# Altium footprint library Standard2.PcbLib: 423 footprints (part 26 of 27)
Each footprint in its own frame and in the unit in brackets; x right, y up, seen from the top. Pads: shape width x height; smd on the part's side, far side on the other; paste and mask are expansions set on the pad; w line width, h text height; cw(c..) or ccw(c..) is an arc to the next point about the centre after c.
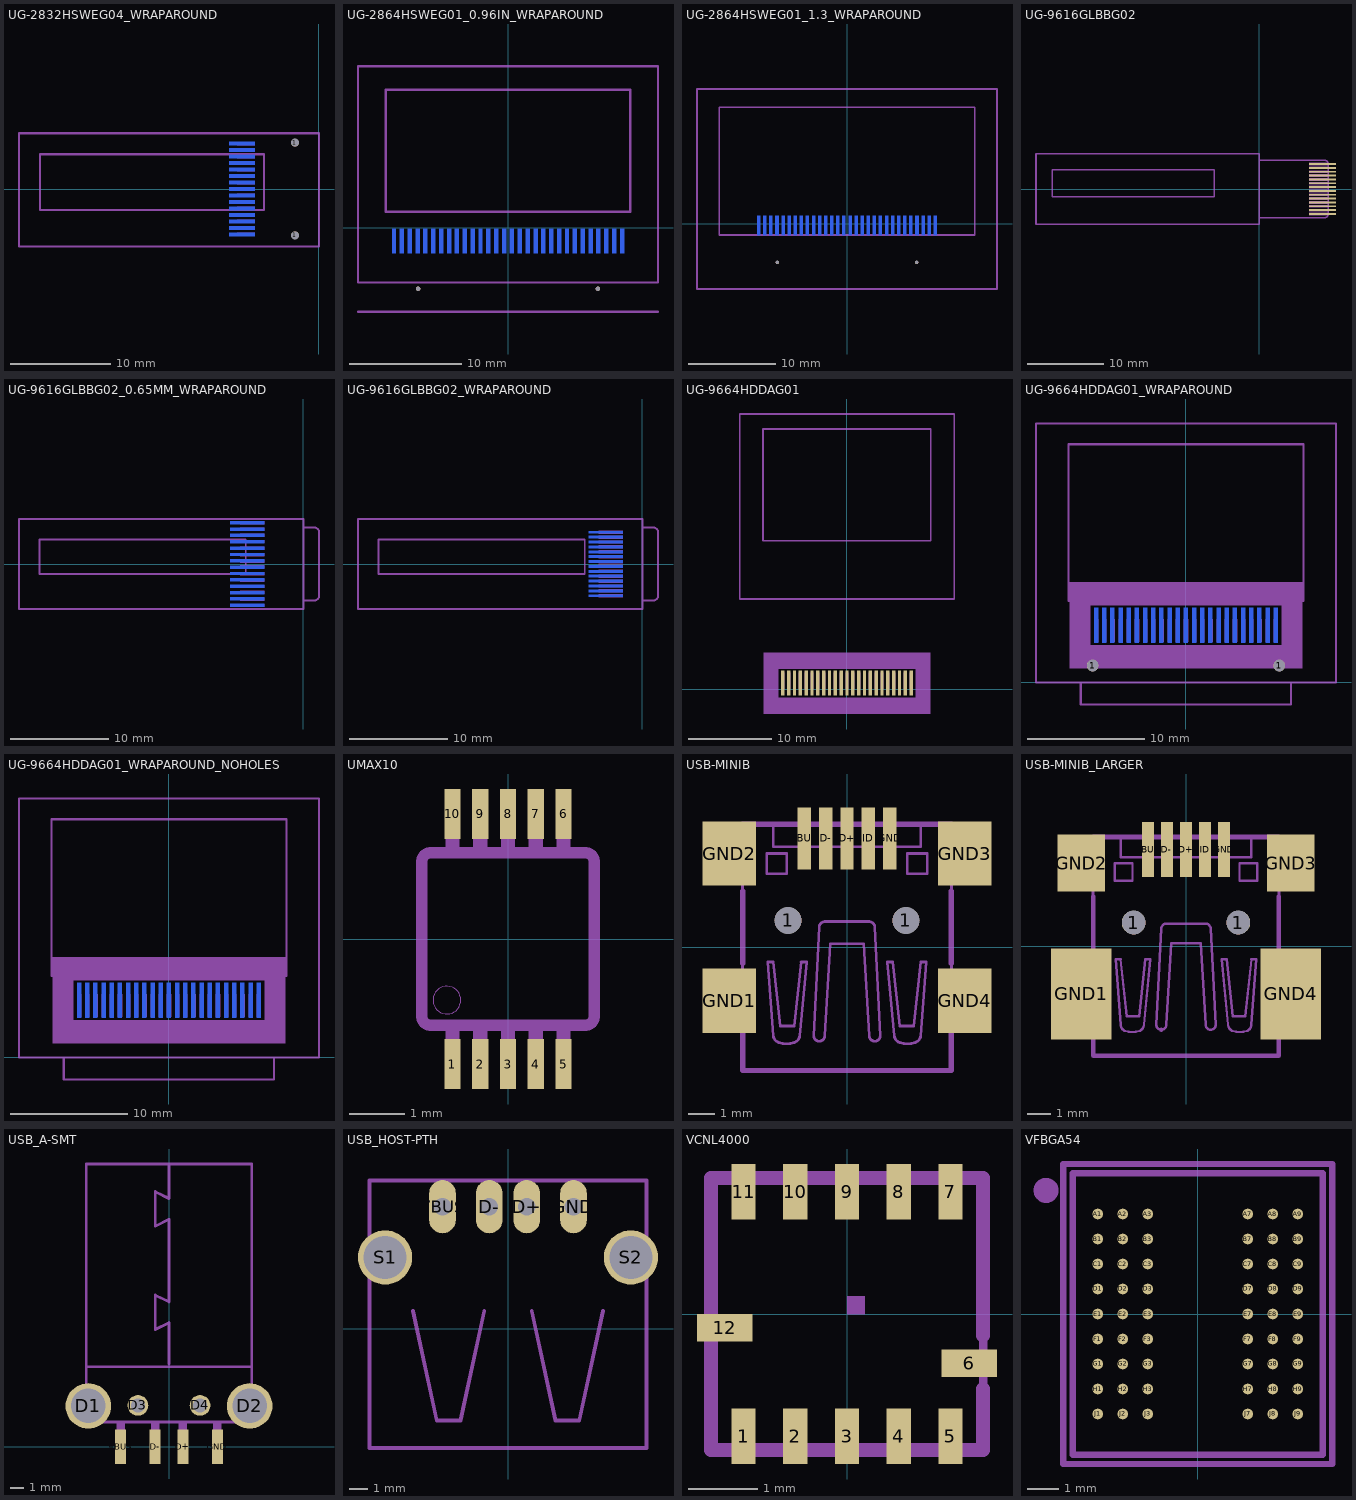
[diagram p25: the footprints below, top view; thin cyan lines are the x and y axes]

## UG-2832HSWEG04_WRAPAROUND [mm]
pads (17):
  rect 2.6x0.35 smd far side: 1(-7.7,-4.55) 2(-7.7,-3.9) 3(-7.7,-3.25) 4(-7.7,-2.6) 5(-7.7,-1.95) 6(-7.7,-1.3) 7(-7.7,-0.65) 8(-7.7,0) 9(-7.7,0.65) 10(-7.7,1.3) 11(-7.7,1.95) 12(-7.7,2.6) 13(-7.7,3.25) 14(-7.7,3.9) 15(-7.7,4.55)
  round 0.8 hole 0.8: 1(-2.4,-4.625) 1(-2.4,4.625)
Mechanical 2:
  lines w0.203: -30,-5.75 0,-5.75 0,5.575 -30,5.575 -30,-5.75
Mechanical 18:
  rectangle: -8.2,4.375 -6.4,4.725
  rectangle: -8.2,3.725 -6.4,4.075
  rectangle: -8.2,3.075 -6.4,3.425
  rectangle: -8.2,2.425 -6.4,2.775
  rectangle: -8.2,1.775 -6.4,2.125
  rectangle: -8.2,1.125 -6.4,1.475
  rectangle: -8.2,0.475 -6.4,0.825
  rectangle: -8.2,-0.175 -6.4,0.175
  rectangle: -8.2,-0.825 -6.4,-0.475
  rectangle: -8.2,-1.475 -6.4,-1.125
  rectangle: -8.2,-2.125 -6.4,-1.775
  rectangle: -8.2,-2.775 -6.4,-2.425
  rectangle: -8.2,-3.425 -6.4,-3.075
  rectangle: -8.2,-4.075 -6.4,-3.725
  rectangle: -8.2,-4.725 -6.4,-4.375
  lines w0.127: -30,-5.75 0,-5.75 ; -30,-5.575 -30,5.575 0,5.575 0,-5.575
  lines w0.203: -27.9,-2.109 -5.516,-2.109 -5.516,3.475 -27.9,3.475 -27.9,-2.109

## UG-2864HSWEG01_0.96IN_WRAPAROUND [mm]
pads (32):
  rect 0.35x2.2 smd far side: 1(-10.15,-1.2) 2(-9.45,-1.2) 3(-8.75,-1.2) 4(-8.05,-1.2) 5(-7.35,-1.2) 6(-6.65,-1.2) 7(-5.95,-1.2) 8(-5.25,-1.2) 9(-4.55,-1.2) 10(-3.85,-1.2) 11(-3.15,-1.2) 12(-2.45,-1.2) 13(-1.75,-1.2) 14(-1.05,-1.2) 15(-0.35,-1.2) 16(0.35,-1.2) 17(1.05,-1.2) 18(1.75,-1.2) 19(2.45,-1.2) 20(3.15,-1.2) 21(3.85,-1.2) 22(4.55,-1.2) 23(5.25,-1.2) 24(5.95,-1.2) 25(6.65,-1.2) 26(7.35,-1.2) 27(8.05,-1.2) 28(8.75,-1.2) 29(9.45,-1.2) 30(10.15,-1.2)
  round 0.4 hole 0.4: 1(-8,-5.45) 1(8,-5.45)
Mechanical 2:
  lines w0.203: -13.353,14.36 13.35,14.36 13.35,-4.9 -13.35,-4.9 -13.353,14.36
Mechanical 18:
  lines w0.203: -13.35,-7.5 13.35,-7.5 ; -10.872,1.396 10.872,1.396 10.872,12.26 -10.872,12.26 -10.872,1.396

## UG-2864HSWEG01_1.3_WRAPAROUND [mm]
pads (32):
  rect 0.35x2.2 smd far side: 1(-10.15,-0.2) 2(-9.45,-0.2) 3(-8.75,-0.2) 4(-8.05,-0.2) 5(-7.35,-0.2) 6(-6.65,-0.2) 7(-5.95,-0.2) 8(-5.25,-0.2) 9(-4.55,-0.2) 10(-3.85,-0.2) 11(-3.15,-0.2) 12(-2.45,-0.2) 13(-1.75,-0.2) 14(-1.05,-0.2) 15(-0.35,-0.2) 16(0.35,-0.2) 17(1.05,-0.2) 18(1.75,-0.2) 19(2.45,-0.2) 20(3.15,-0.2) 21(3.85,-0.2) 22(4.55,-0.2) 23(5.25,-0.2) 24(5.95,-0.2) 25(6.65,-0.2) 26(7.35,-0.2) 27(8.05,-0.2) 28(8.75,-0.2) 29(9.45,-0.2) 30(10.15,-0.2)
  round 0.4 hole 0.4: 1(-8,-4.45) 1(8,-4.45)
Mechanical 2:
  lines w0.203: -17.25,-7.5 17.25,-7.5 17.25,15.5 -17.25,15.5 -17.25,-7.5
Mechanical 18:
  lines w0.203: -14.7,-1.3 14.7,-1.3 14.7,13.4 -14.7,13.4 -14.7,-1.3

## UG-9616GLBBG02 [mil]
pads (14):
  rect 137.8x10 smd: 1(324.8,-127.95) 2(324.8,-108.27) 3(324.8,-88.58) 4(324.8,-68.9) 5(324.8,-49.21) 6(324.8,-29.53) 7(324.8,-9.84) 8(324.8,9.84) 9(324.8,29.53) 10(324.8,49.21) 11(324.8,68.9) 12(324.8,88.58) 13(324.8,108.27) 14(324.8,127.95)
Mechanical 2:
  lines w8: -1145.67,-181.1 -1145.67,181.1 0,181.1 0,-181.1 -1145.67,-181.1
Mechanical 18:
  rectangle: 255.91,121.06 354.33,134.84
  rectangle: 255.91,101.38 354.33,115.16
  rectangle: 255.91,81.69 354.33,95.47
  rectangle: 255.91,62.01 354.33,75.79
  rectangle: 255.91,42.32 354.33,56.1
  rectangle: 255.91,22.64 354.33,36.42
  rectangle: 255.91,2.95 354.33,16.73
  rectangle: 255.91,-16.73 354.33,-2.95
  rectangle: 255.91,-36.42 354.33,-22.64
  rectangle: 255.91,-56.1 354.33,-42.32
  rectangle: 255.91,-75.79 354.33,-62.01
  rectangle: 255.91,-95.47 354.33,-81.69
  rectangle: 255.91,-115.16 354.33,-101.38
  rectangle: 255.91,-134.84 354.33,-121.06
  lines w5: -1145.67,-181.1 0,-181.1 0,181.1 -1145.67,181.1 -1145.67,-181.1
  lines w8: 0,-147.64 334.65,-147.64 ccw(c334.64,-127.95) 354.33,-127.95 354.33,127.95 ccw(c334.64,127.95) 334.65,147.64 0,147.64 ; -1062.99,-39.53 -232.13,-39.53 -232.13,98.43 -1062.99,98.43 -1062.99,-39.53

## UG-9616GLBBG02_0.65MM_WRAPAROUND [mm]
pads (14):
  rect 3.5x0.3 smd far side: 1(-5.75,-4.225) 2(-5.75,-3.575) 3(-5.75,-2.925) 4(-5.75,-2.275) 5(-5.75,-1.625) 6(-5.75,-0.975) 7(-5.75,-0.325) 8(-5.75,0.325) 9(-5.75,0.975) 10(-5.75,1.625) 11(-5.75,2.275) 12(-5.75,3.575) 13(-5.75,2.925) 14(-5.75,4.225)
Mechanical 2:
  lines w0.203: -29.1,-4.6 -29.1,4.6 0,4.6 0,-4.6 -29.1,-4.6
Mechanical 18:
  rectangle: -6.5,4.025 -4,4.375
  rectangle: -6.5,3.375 -4,3.725
  rectangle: -6.5,2.775 -4,3.125
  rectangle: -6.5,2.125 -4,2.475
  rectangle: -6.5,1.425 -4,1.775
  rectangle: -6.5,0.775 -4,1.125
  rectangle: -6.5,0.125 -4,0.475
  rectangle: -6.5,-0.475 -4,-0.125
  rectangle: -6.5,-1.175 -4,-0.825
  rectangle: -6.5,-1.825 -4,-1.475
  rectangle: -6.5,-2.475 -4,-2.125
  rectangle: -6.5,-3.075 -4,-2.725
  rectangle: -6.5,-3.775 -4,-3.425
  rectangle: -6.5,-4.425 -4,-4.075
  lines w0.127: -29.1,-4.6 0,-4.6 0,-3.75 0,3.75 0,4.6 -29.1,4.6 -29.1,-4.6
  lines w0.203: 0,-3.75 1.1,-3.75 ccw(c1.1,-3.25) 1.6,-3.25 1.6,3.25 ccw(c1.1,3.25) 1.1,3.75 0,3.75 ; -27,-1.004 -5.896,-1.004 -5.896,2.5 -27,2.5 -27,-1.004

## UG-9616GLBBG02_WRAPAROUND [mil]
pads (14):
  rect 137.8x10 smd far side: 1(-147.64,-127.95) 2(-147.64,-108.27) 3(-147.64,-88.58) 4(-147.64,-68.9) 5(-147.64,-49.21) 6(-147.64,-29.53) 7(-147.64,-9.84) 8(-147.64,9.84) 9(-147.64,29.53) 10(-147.64,49.21) 11(-147.64,68.9) 12(-147.64,88.58) 13(-147.64,108.27) 14(-147.64,127.95)
Mechanical 2:
  lines w8: -1145.67,-181.1 0,-181.1 0,181.1 -1145.67,181.1 -1145.67,-181.1
Mechanical 18:
  rectangle: -177.17,-134.84 -78.74,-121.06
  rectangle: -177.17,-115.16 -78.74,-101.38
  rectangle: -177.17,-95.47 -78.74,-81.69
  rectangle: -177.17,-75.79 -78.74,-62.01
  rectangle: -177.17,-56.1 -78.74,-42.32
  rectangle: -177.17,-36.42 -78.74,-22.64
  rectangle: -177.17,-16.73 -78.74,-2.95
  rectangle: -177.17,2.95 -78.74,16.73
  rectangle: -177.17,22.64 -78.74,36.42
  rectangle: -177.17,42.32 -78.74,56.1
  rectangle: -177.17,62.01 -78.74,75.79
  rectangle: -177.17,81.69 -78.74,95.47
  rectangle: -177.17,101.38 -78.74,115.16
  rectangle: -177.17,121.06 -78.74,134.84
  lines w5: -1145.67,-181.1 -1145.67,181.1 0,181.1 0,147.64 0,-147.64 0,-181.1 -1145.67,-181.1
  lines w8: 0,-147.64 43.31,-147.64 ccw(c43.3,-127.95) 62.99,-127.95 62.99,127.95 ccw(c43.3,127.95) 43.31,147.64 0,147.64 ; -1062.99,-39.53 -1062.99,98.43 -232.13,98.43 -232.13,-39.53 -1062.99,-39.53

## UG-9664HDDAG01 [mm]
pads (23):
  rect 0.4x3 smd: 1(-7.7,0.7) 2(-7,0.7) 3(-6.3,0.7) 4(-5.6,0.7) 5(-4.9,0.7) 6(-4.2,0.7) 7(-3.5,0.7) 8(-2.8,0.7) 9(-2.1,0.7) 10(-1.4,0.7) 11(-0.7,0.7) 12(0,0.7) 13(0.7,0.7) 14(1.4,0.7) 15(2.1,0.7) 16(2.8,0.7) 17(3.5,0.7) 18(4.2,0.7) 19(4.9,0.7) 20(5.6,0.7) 21(6.3,0.7) 22(7,0.7) 23(7.7,0.7)
Mechanical 1:
  rectangle: -7.9,0 -7.5,2
  rectangle: -7.2,0 -6.8,2
  rectangle: -6.5,0 -6.1,2
  rectangle: -5.8,0 -5.4,2
  rectangle: -5.1,0 -4.7,2
  rectangle: -4.4,0 -4,2
  rectangle: -3.7,0 -3.3,2
  rectangle: -3,0 -2.6,2
  rectangle: -2.3,0 -1.9,2
  rectangle: -1.6,0 -1.2,2
  rectangle: -0.9,0 -0.5,2
  rectangle: -0.2,0 0.2,2
  rectangle: 0.5,0 0.9,2
  rectangle: 1.2,0 1.6,2
  rectangle: 1.9,0 2.3,2
  rectangle: 2.6,0 3,2
  rectangle: 3.3,0 3.7,2
  rectangle: 4,0 4.4,2
  rectangle: 4.7,0 5.1,2
  rectangle: 5.4,0 5.8,2
  rectangle: 6.1,0 6.5,2
  rectangle: 6.8,0 7.2,2
  rectangle: 7.5,0 7.9,2
Mechanical 12:
  rectangle: -10,-3 10,-1
  rectangle: -10,2.4 10,4.4
  rectangle: -10,-1 -8.2,2.4
  rectangle: 8.2,-1 10,2.4
Mechanical 18:
  lines w0.203: -12.85,10.8 12.86,10.8 12.86,33 -12.85,33 -12.85,10.8 ; -10.07,17.79 10.07,17.79 10.07,31.21 -10.07,31.21 -10.07,17.79

## UG-9664HDDAG01_WRAPAROUND [mm]
pads (25):
  round 1 hole 1: 1(-8,1.45) 1(8,1.45)
  rect 0.35x3 smd far side: 1(-7.7,4.9) 2(-7,4.9) 3(-6.3,4.9) 4(-5.6,4.9) 5(-4.9,4.9) 6(-4.2,4.9) 7(-3.5,4.9) 8(-2.8,4.9) 9(-2.1,4.9) 10(-1.4,4.9) 11(-0.7,4.9) 12(0,4.9) 13(0.7,4.9) 14(1.4,4.9) 15(2.1,4.9) 16(2.8,4.9) 17(3.5,4.9) 18(4.2,4.9) 19(4.9,4.9) 20(5.6,4.9) 21(6.3,4.9) 22(7,4.9) 23(7.7,4.9)
Mechanical 12:
  rectangle: -10,1.2 10,3.2
  rectangle: -10,6.6 10,8.6
  region: -8.2,6.6 -10,6.6 -10,3.2 -8.2,3.2
  rectangle: 8.2,3.2 10,6.6
Mechanical 18:
  rectangle: -7.9,3.45 -7.5,5.45
  rectangle: -7.2,3.45 -6.8,5.45
  rectangle: -6.5,3.45 -6.1,5.45
  rectangle: -5.8,3.45 -5.4,5.45
  rectangle: -5.1,3.45 -4.7,5.45
  rectangle: -4.4,3.45 -4,5.45
  rectangle: -3.7,3.45 -3.3,5.45
  rectangle: -3,3.45 -2.6,5.45
  rectangle: -2.3,3.45 -1.9,5.45
  rectangle: -1.6,3.45 -1.2,5.45
  rectangle: -0.9,3.45 -0.5,5.45
  rectangle: -0.2,3.45 0.2,5.45
  rectangle: 0.5,3.45 0.9,5.45
  rectangle: 1.2,3.45 1.6,5.45
  rectangle: 1.9,3.45 2.3,5.45
  rectangle: 2.6,3.45 3,5.45
  rectangle: 3.3,3.45 3.7,5.45
  rectangle: 4,3.45 4.4,5.45
  rectangle: 4.7,3.45 5.1,5.45
  rectangle: 5.4,3.45 5.8,5.45
  rectangle: 6.1,3.45 6.5,5.45
  rectangle: 6.8,3.45 7.2,5.45
  rectangle: 7.5,3.45 7.9,5.45
  lines w0.203: -9,0 -12.85,0 -12.85,22.2 12.86,22.2 12.86,0 9,0 ; -9,0 9,0 ; -9,0 -9,-1.89 9,-1.89 9,0 ; -10.07,6.99 10.07,6.99 10.07,20.41 -10.07,20.41 -10.07,6.99

## UG-9664HDDAG01_WRAPAROUND_NOHOLES [mm]
pads (23):
  rect 0.35x3 smd far side: 1(-7.7,4.9) 2(-7,4.9) 3(-6.3,4.9) 4(-5.6,4.9) 5(-4.9,4.9) 6(-4.2,4.9) 7(-3.5,4.9) 8(-2.8,4.9) 9(-2.1,4.9) 10(-1.4,4.9) 11(-0.7,4.9) 12(0,4.9) 13(0.7,4.9) 14(1.4,4.9) 15(2.1,4.9) 16(2.8,4.9) 17(3.5,4.9) 18(4.2,4.9) 19(4.9,4.9) 20(5.6,4.9) 21(6.3,4.9) 22(7,4.9) 23(7.7,4.9)
Mechanical 12:
  rectangle: -10,1.2 10,3.2
  rectangle: -10,6.6 10,8.6
  region: -8.2,6.6 -10,6.6 -10,3.2 -8.2,3.2
  rectangle: 8.2,3.2 10,6.6
Mechanical 18:
  rectangle: -7.9,3.45 -7.5,5.45
  rectangle: -7.2,3.45 -6.8,5.45
  rectangle: -6.5,3.45 -6.1,5.45
  rectangle: -5.8,3.45 -5.4,5.45
  rectangle: -5.1,3.45 -4.7,5.45
  rectangle: -4.4,3.45 -4,5.45
  rectangle: -3.7,3.45 -3.3,5.45
  rectangle: -3,3.45 -2.6,5.45
  rectangle: -2.3,3.45 -1.9,5.45
  rectangle: -1.6,3.45 -1.2,5.45
  rectangle: -0.9,3.45 -0.5,5.45
  rectangle: -0.2,3.45 0.2,5.45
  rectangle: 0.5,3.45 0.9,5.45
  rectangle: 1.2,3.45 1.6,5.45
  rectangle: 1.9,3.45 2.3,5.45
  rectangle: 2.6,3.45 3,5.45
  rectangle: 3.3,3.45 3.7,5.45
  rectangle: 4,3.45 4.4,5.45
  rectangle: 4.7,3.45 5.1,5.45
  rectangle: 5.4,3.45 5.8,5.45
  rectangle: 6.1,3.45 6.5,5.45
  rectangle: 6.8,3.45 7.2,5.45
  rectangle: 7.5,3.45 7.9,5.45
  lines w0.203: -9,0 -12.85,0 -12.85,22.2 12.86,22.2 12.86,0 9,0 ; -9,0 9,0 ; -9,0 -9,-1.89 9,-1.89 9,0 ; -10.07,6.99 10.07,6.99 10.07,20.41 -10.07,20.41 -10.07,6.99

## UMAX10 [mm]
pads (10):
  rect 0.29x0.9 smd: 1(-1,-2.25) 2(-0.5,-2.25) 3(0,-2.25) 4(0.5,-2.25) 5(1,-2.25) 6(1,2.25) 7(0.5,2.25) 8(0,2.25) 9(-0.5,2.25) 10(-1,2.25)
Mechanical 2:
  circle w0: c-1.1,-1.1 r0.25
  lines w0.203: -1.55,-1.4 ccw(c-1.4,-1.4) -1.4,-1.55 1.4,-1.55 ccw(c1.4,-1.4) 1.55,-1.4 1.55,1.4 ccw(c1.4,1.4) 1.4,1.55 -1.4,1.55 ccw(c-1.4,1.4) -1.55,1.4 -1.55,-1.4
Mechanical 18:
  rectangle: -1.127,-2.565 -0.873,-1.626
  rectangle: -0.627,-2.565 -0.373,-1.626
  rectangle: -0.127,-2.565 0.127,-1.626
  rectangle: 0.373,-2.565 0.627,-1.626
  rectangle: 0.873,-2.565 1.127,-1.626
  rectangle: 0.873,1.626 1.127,2.565
  rectangle: 0.373,1.626 0.627,2.565
  rectangle: -0.127,1.626 0.127,2.565
  rectangle: -0.627,1.626 -0.373,2.565
  rectangle: -1.127,1.626 -0.873,2.565

## USB-MINIB [mm]
pads (11):
  round 1 hole 1: 1(-2.2,1) 1(2.2,1)
  rect 0.5x2.308 smd: D+(0,4.064) D-(-0.8,4.064) GND(1.6,4.064) ID(0.8,4.064) VBUS(-1.6,4.064)
  rect 2x2.4 smd: GND1(-4.4,-2) GND2(-4.4,3.5) GND3(4.4,3.5) GND4(4.4,-2)
Mechanical 2:
  lines w0.203: -3.9,-0.6 -3.9,2.1 ; -3.2,4.6 -2.1,4.6 ; 2.1,4.6 3.2,4.6 ; 3.9,-0.6 3.9,2.1
Mechanical 18:
  lines w0.102: -5.08,-2.67 -5.08,-2.32 ccw(c-5.08,-2.02) -5.08,-1.72 -5.08,-1.32 ; -5.08,2.87 -5.08,3.22 ccw(c-5.08,3.52) -5.08,3.82 -5.08,4.22 ; -5.06,-2.679 -3.91,-2.679 ; -5.06,-1.301 -3.91,-1.301 ; -5.06,2.861 -3.91,2.861 ; -5.06,4.239 -3.91,4.239 ; -2.75,4.5 -2.75,3.75 2.75,3.75 2.75,4.5 ; -1.038,-3.506 cw(c-1.038,-3.299) -1.246,-3.298 -1.038,0.751 cw(c-0.819,0.739) -0.831,0.958 0.83,0.958 cw(c0.818,0.739) 1.038,0.751 1.246,-3.298 cw(c1.038,-3.299) 1.038,-3.506 cw(c1.038,-3.298) 0.83,-3.298 0.623,0.128 -0.623,0.128 -0.831,-3.298 cw(c-1.038,-3.299) -1.038,-3.506 ; 3.88,-2.659 5.03,-2.659 ; 3.88,-1.281 5.03,-1.281 ; 3.88,2.881 5.03,2.881 ; 3.88,4.259 5.03,4.259 ; 5.05,-2.64 5.05,-2.24 cw(c5.05,-1.94) 5.05,-1.64 5.05,-1.29 ; 5.05,2.9 5.05,3.3 cw(c5.05,3.6) 5.05,3.9 5.05,4.25 ; -3,2.75 -2.25,2.75 -2.25,3.5 -3,3.5 -3,2.75 ; -2.959,-0.547 -2.751,-3.298 ccw(c-2.457,-3.276) -2.544,-3.558 ccw(c-2.258,-2.627) -1.973,-3.558 ccw(c-2.059,-3.276) -1.765,-3.298 -1.505,-0.547 -1.713,-0.547 -1.973,-2.935 -2.492,-2.935 -2.751,-0.547 -2.959,-0.547 ; 1.505,-0.547 1.765,-3.298 ccw(c2.059,-3.276) 1.973,-3.558 ccw(c2.258,-2.627) 2.544,-3.558 ccw(c2.457,-3.276) 2.751,-3.298 2.959,-0.547 2.751,-0.547 2.492,-2.935 1.973,-2.935 1.713,-0.547 1.505,-0.547 ; 2.25,2.75 2.25,3.5 3,3.5 3,2.75 2.25,2.75
  lines w0.127: -3.9,-1.29 -3.9,2.81 ; 3.9,-1.24 3.9,2.86
  lines w0.203: -3.9,-2.7 -3.9,-4.6 3.9,-4.6 3.9,-2.7 ; -3.9,4.25 -3.9,4.6 3.9,4.6 3.9,4.3

## USB-MINIB_LARGER [mm]
pads (11):
  round 1 hole 1: 1(-2.2,1) 1(2.2,1)
  rect 0.5x2.308 smd: D+(0,4.064) D-(-0.8,4.064) GND(1.6,4.064) ID(0.8,4.064) VBUS(-1.6,4.064)
  rect 2.54x3.81 smd: GND1(-4.4,-2) GND4(4.4,-2)
  rect 2x2.4 smd: GND2(-4.4,3.5) GND3(4.4,3.5)
Mechanical 2:
  lines w0.203: -3.9,-0.6 -3.9,2.1 ; -3.2,4.6 -2.1,4.6 ; -1.038,-3.506 -1.038,-3.506 ; 2.1,4.6 3.2,4.6 ; 3.9,-0.6 3.9,2.1
Mechanical 18:
  lines w0.102: -5.08,-2.67 -5.08,-2.32 ccw(c-5.08,-2.02) -5.08,-1.72 -5.08,-1.32 ; -5.08,2.87 -5.08,3.22 ccw(c-5.08,3.52) -5.08,3.82 -5.08,4.22 ; -5.06,-2.679 -3.91,-2.679 ; -5.06,-1.301 -3.91,-1.301 ; -5.06,2.861 -3.91,2.861 ; -5.06,4.239 -3.91,4.239 ; -2.75,4.5 -2.75,3.75 2.75,3.75 2.75,4.5 ; -1.038,-3.506 cw(c-1.038,-3.299) -1.246,-3.298 -1.038,0.751 cw(c-0.819,0.739) -0.831,0.958 0.83,0.958 cw(c0.818,0.739) 1.038,0.751 1.246,-3.298 cw(c1.038,-3.299) 1.038,-3.506 cw(c1.038,-3.298) 0.83,-3.298 0.623,0.128 -0.623,0.128 -0.831,-3.298 cw(c-1.038,-3.299) -1.038,-3.506 ; 3.88,-2.659 5.03,-2.659 ; 3.88,-1.281 5.03,-1.281 ; 3.88,2.881 5.03,2.881 ; 3.88,4.259 5.03,4.259 ; 5.05,-2.64 5.05,-2.24 cw(c5.05,-1.94) 5.05,-1.64 5.05,-1.29 ; 5.05,2.9 5.05,3.3 cw(c5.05,3.6) 5.05,3.9 5.05,4.25 ; -3,2.75 -2.25,2.75 -2.25,3.5 -3,3.5 -3,2.75 ; -2.959,-0.547 -2.751,-3.298 ccw(c-2.457,-3.276) -2.544,-3.558 ccw(c-2.258,-2.627) -1.973,-3.558 ccw(c-2.059,-3.276) -1.765,-3.298 -1.505,-0.547 -1.713,-0.547 -1.973,-2.935 -2.492,-2.935 -2.751,-0.547 -2.959,-0.547 ; 1.505,-0.547 1.765,-3.298 ccw(c2.059,-3.276) 1.973,-3.558 ccw(c2.258,-2.627) 2.544,-3.558 ccw(c2.457,-3.276) 2.751,-3.298 2.959,-0.547 2.751,-0.547 2.492,-2.935 1.973,-2.935 1.713,-0.547 1.505,-0.547 ; 2.25,2.75 2.25,3.5 3,3.5 3,2.75 2.25,2.75
  lines w0.127: -3.9,-1.29 -3.9,2.81 ; 3.9,-1.24 3.9,2.86
  lines w0.203: -3.9,-2.7 -3.9,-4.6 3.9,-4.6 3.9,-2.7 ; -3.9,4.25 -3.9,4.6 3.9,4.6 3.9,4.3

## USB_A-SMT [mm]
pads (8):
  round 3.302 hole 2.5: D1(-5.85,2.958) D2(5.85,2.958)
  round 1.5 hole 1: D3(-2.25,3) D4(2.25,3)
  rect 0.8x2.5 smd: D+(1,0) D-(-1,0) GND(3.5,0) VBUS(-3.5,0)
Mechanical 2:
  lines w0.203: -6,4.758 -6,5.75 ; 6,4.758 6,5.75
Mechanical 18:
  rectangle: -1.3,0 -0.7,1.8
  rectangle: 0.7,0 1.3,1.8
  rectangle: -3.8,0 -3.2,1.8
  rectangle: 3.2,0 3.8,1.8
  lines w0.203: 0,6 0,9 -1,8.5 -1,11 0,10.5 0,16.5 -1,16 -1,18.5 0,18 0,20.5 ; 6,5.8 -6,5.8 ; -6,5.8 -6,1.8 6,1.8 6,20.5 0,20.5 ; -6,5.8 -6,20.5 0,20.5

## USB_HOST-PTH [mm]
pads (6):
  oval 1.425x2.85 hole 0.95: D+(1,6.52) D-(-1,6.52) GND(3.5,6.52) VBUS(-3.5,6.52)
  round 2.9 hole 2.3: S1(-6.57,3.81) S2(6.57,3.81)
Mechanical 2:
  lines w0.203: -5.08,0.94 -3.81,-4.91 -2.54,-4.91 -1.27,0.94 ; 1.27,0.94 2.54,-4.91 3.81,-4.91 5.08,0.94 ; -7.4,-6.38 7.4,-6.38 7.4,7.92 -7.4,7.92 -7.4,-6.38

## VCNL4000 [mm]
pads (12):
  rect 0.35x0.805 smd: 1(-1.5,-1.772) 2(-0.75,-1.772) 3(0,-1.772) 4(0.75,-1.772) 5(1.5,-1.772) 7(1.5,1.772) 8(0.75,1.772) 9(0,1.772) 10(-0.75,1.772) 11(-1.5,1.772)
  rect 0.805x0.4 smd: 6(1.772,-0.715) 12(-1.772,-0.2)
Mechanical 2:
  lines w0.203: -1.975,-1.975 -1.975,-0.688 ; -1.975,0.187 -1.975,1.975 ; 1.975,-1.975 1.975,-1.088 ; 1.975,-0.312 1.975,1.975
Mechanical 12:
  region: 0,0 0.254,0 0.254,0.254 0,0.254
Mechanical 18:
  lines w0.127: 1.975,-1.975 1.975,1.975
  lines w0.203: 1.975,-1.975 -1.975,-1.975 -1.975,1.975 1.975,1.975

## VFBGA54 [mil]
pads (54):
  rrect100% 13.39x13.39 smd: A1(-125.98,125.98) A2(-94.49,125.98) A3(-62.99,125.98) A7(62.99,125.98) A8(94.49,125.98) A9(125.98,125.98) B1(-125.98,94.49) B2(-94.49,94.49) B3(-62.99,94.49) B7(62.99,94.49) B8(94.49,94.49) B9(125.98,94.49) C1(-125.98,62.99) C2(-94.49,62.99) C3(-62.99,62.99) C7(62.99,62.99) C8(94.49,62.99) C9(125.98,62.99) D1(-125.98,31.5) D2(-94.49,31.5) D3(-62.99,31.5) D7(62.99,31.5) D8(94.49,31.5) D9(125.98,31.5) E1(-125.98,0) E2(-94.49,0) E3(-62.99,0) E7(62.99,0) E8(94.49,0) E9(125.98,0) F1(-125.98,-31.5) F2(-94.49,-31.5) F3(-62.99,-31.5) F7(62.99,-31.5) F8(94.49,-31.5) F9(125.98,-31.5) G1(-125.98,-62.99) G2(-94.49,-62.99) G3(-62.99,-62.99) G7(62.99,-62.99) G8(94.49,-62.99) G9(125.98,-62.99) H1(-125.98,-94.49) H2(-94.49,-94.49) H3(-62.99,-94.49) H7(62.99,-94.49) H8(94.49,-94.49) H9(125.98,-94.49) J1(-125.98,-125.98) J2(-94.49,-125.98) J3(-62.99,-125.98) J7(62.99,-125.98) J8(94.49,-125.98) J9(125.98,-125.98)
Mechanical 2:
  circle w15.75: c-191.1,155.67 r7.87
  lines w8: -169.29,-188.98 -169.29,188.98 169.29,188.98 169.29,-188.98 -169.29,-188.98
Mechanical 18:
  lines w8: -157.48,-177.17 -157.48,177.17 157.48,177.17 157.48,-177.17 -157.48,-177.17